# Altium schematic symbol library LATTICEPLDS_Library.SchLib: 291 symbols (part 1 of 32) (continued)
## iCE40HX1K-TQ144
designator U?
SPLIT_INST: TRUE; SWAP_INFO: (S1+S2+S3+S4+S5+S6)
part A pins: 112 IOT_73 (io), 113 IOT_74 (io), 114 IOT_75 (io), 115 IOT_76 (io), 116 IOT_77 (io), 117 IOT_78 (io), 118 IOT_79 (io), 119 IOT_80 (io), 120 IOT_81 (io), 121 IOT_82 (io), 122 IOT_83 (io), 123 VCCIO_0 (power), 128 IOT_84_GBIN1 (io), 129 IOT_85_GBIN0 (io), 133 VCCIO_0 (power), 134 IOT_87 (io), 135 IOT_88 (io), 136 IOT_89 (io), 137 IOT_90 (io), 138 IOT_91 (io), 139 IOT_92 (io), 141 IOT_93 (io), 142 IOT_94 (io), 143 IOT_95 (io), 144 IOT_96 (io)
part B pins: 73 IOR_48 (io), 74 IOR_49 (io), 75 IOR_50 (io), 76 IOR_51 (io), 78 IOR_52 (io), 79 IOR_53 (io), 80 IOR_54 (io), 81 IOR_55 (io), 87 IOR_56 (io), 88 IOR_57 (io), 89 VCCIO_1 (power), 90 IOR_58 (io), 91 IOR_59 (io), 93 IOR_60_GBIN3 (io), 94 IOR_61_GBIN2 (io), 95 IOR_62 (io), 96 IOR_63 (io), 97 IOR_64 (io), 98 IOR_65 (io), 99 IOR_66 (io), 100 VCCIO_1 (power), 101 IOR_67 (io), 102 IOR_68 (io), 104 IOR_69 (io), 105 IOR_70 (io), 106 IOR_71 (io), 107 IOR_72 (io)
part C pins: 37 IOB_24 (io), 38 IOB_25 (io), 39 IOB_26 (io), 41 IOB_27 (io), 42 IOB_28 (io), 43 IOB_29 (io), 44 IOB_30 (io), 45 IOB_31 (io), 46 VCCIO_2 (power), 47 IOB_32 (io), 48 IOB_33 (io), 49 IOB_35_GBIN5 (io), 50 IOB_36_GBIN4 (io), 52 IOB_34 (io), 56 IOB_37 (io), 57 VCCIO_2 (power), 58 IOB_38 (io), 60 IOB_39 (io), 61 IOB_40 (io), 62 IOB_41 (io), 63 IOB_42_CBSEL0 (io), 64 IOB_43_CBSEL1 (io), 65 CDONE (io), 66 CRESET_B (io)
part D pins: 1 IOL_1A (io), 2 IOL_1B (io), 3 IOL_2A (io), 4 IOL_2B (io), 6 VCCIO_3 (power), 7 IOL_3A (io), 8 IOL_3B (io), 9 IOL_4A (io), 10 IOL_4B (io), 11 IOL_5A (io), 12 IOL_5B (io), 19 IOL_6A (io), 20 IOL_6B_GBIN7 (io), 21 IOL_7A_GBIN6 (io), 22 IOL_7B (io), 23 IOL_8A (io), 24 IOL_8B (io), 25 IOL_9A (io), 26 IOL_9B (io), 28 IOL_10A (io), 29 IOL_10B (io), 30 VCCIO_3 (power), 31 IOL_11A (io), 32 IOL_11B (io), 33 IOL_12A (io), 34 IOL_12B (io)
part E pins: 67 IOB_44_SDO (io), 68 IOB_45_SDI (io), 70 IOB_46_SCK (io), 71 IOB_47_SS (io), 72 VCC_SPI (power)
part F pins: 5 GND (power), 13 GND (power), 14 GND (power), 15 NC (power), 16 NC (power), 17 NC (power), 18 NC (power), 27 VCC (power), 35 GNDPLL (power), 36 VCCPLL (power), 40 NC (power), 51 VCC (power), 53 NC (power), 54 NC (power), 55 NC (power), 59 GND (power), 69 GND (power), 77 NC (power), 82 NC (power), 83 NC (power), 84 NC (power), 85 NC (power), 86 GND (power), 92 VCC (power), 103 GND (power), 108 VPP_2V5 (power), 109 VPP_FAST (power), 110 NC (power), 111 VCC (power), 124 NC (power), 125 NC (power), 126 NC (power), 127 NC (power), 130 NC (power), 131 NC (power), 132 GND (power), 140 GND (power)
part A text: BANK0
part B text: BANK1
part C text: BANK2
part D text: BANK3
part E text: SPI
part F text: POWER

## iCE40HX1K-VQ100
designator U?
SPLIT_INST: TRUE; SWAP_INFO: (S1+S2+S3+S4+S5+S6)
part A pins: 78 IOT_73 (io), 79 IOT_74 (io), 80 IOT_75 (io), 81 IOT_77 (io), 82 IOT_78 (io), 83 IOT_79 (io), 85 IOT_80 (io), 86 IOT_81 (io), 87 IOT_82 (io), 88 VCCIO_0 (power), 89 IOT_84_GBIN1 (io), 90 IOT_85_GBIN0 (io), 91 IOT_86 (io), 92 VCCIO_0 (power), 93 IOT_87 (io), 94 IOT_88 (io), 95 IOT_89 (io), 96 IOT_90 (io), 97 IOT_91 (io), 99 IOT_93 (io), 100 IOT_95 (io)
part B pins: 51 IOR_52 (io), 52 IOR_53 (io), 53 IOR_54 (io), 54 IOR_55 (io), 56 IOR_56 (io), 57 IOR_57 (io), 58 VCCIO_1 (power), 59 IOR_58 (io), 60 IOR_59 (io), 62 IOR_60_GBIN3 (io), 63 IOR_61_GBIN2 (io), 64 IOR_63 (io), 65 IOR_64 (io), 66 IOR_65 (io), 67 VCCIO_1 (power), 68 IOR_67 (io), 69 IOR_68 (io), 71 IOR_69 (io), 72 IOR_70 (io), 73 IOR_71 (io), 74 IOR_72 (io)
part C pins: 26 IOB_26 (io), 27 IOB_27 (io), 28 IOB_28 (io), 29 IOB_29 (io), 30 IOB_30 (io), 31 VCCIO_2 (power), 33 IOB_35_GBIN5 (io), 34 IOB_36_GBIN4 (io), 36 IOB_34 (io), 37 IOB_37 (io), 38 VCCIO_2 (power), 40 IOB_41 (io), 41 IOB_42_CBSEL0 (io), 42 IOB_43_CBSEL1 (io), 43 CDONE (io), 44 CRESET_B (io)
part D pins: 1 IOL_1A (io), 2 IOL_1B (io), 3 IOL_2A (io), 4 IOL_2B (io), 6 VCCIO_3 (power), 7 IOL_3A (io), 8 IOL_3B (io), 9 IOL_5A (io), 10 IOL_5B (io), 12 IOL_6A (io), 13 IOL_6B_GBIN7 (io), 14 VCCIO_3 (power), 15 IOL_7A_GBIN6 (io), 16 IOL_7B (io), 18 IOL_8A (io), 19 IOL_8B (io), 20 IOL_10A (io), 21 IOL_10B (io), 22 VCCIO_3 (power), 24 IOL_12A (io), 25 IOL_12B (io)
part E pins: 45 IOB_44_SDO (io), 46 IOB_45_SDI (io), 48 IOB_46_SCK (io), 49 IOB_47_SS (io), 50 VCC_SPI (power)
part F pins: 5 GND (power), 11 VCC (power), 17 GND (power), 23 GND (power), 32 GND (power), 35 VCC (power), 39 GND (power), 47 GND (power), 55 GND (power), 61 VCC (power), 70 GND (power), 75 VPP_2V5 (power), 76 VPP_FAST (power), 77 VCC (power), 84 GND (power), 98 GND (power)
part A text: BANK0
part B text: BANK1
part C text: BANK2
part D text: BANK3
part E text: SPI
part F text: POWER

## iCE40HX4K-CB132
designator U?
SPLIT_INST: TRUE; SWAP_INFO: (S1+S2+S3+S4+S5+S6)
part A pins: A1 IOT_225 (io), A2 IOT_223 (io), A3 IOT_222 (io), A4 IOT_219 (io), A5 IOT_208 (io), A6 IOT_198_GBIN0 (io), A7 IOT_197_GBIN1 (io), A8 VCCIO_0 (power), A10 IOT_181 (io), A11 IOT_179 (io), A12 IOT_170 (io), C4 IOT_221 (io), C5 IOT_212 (io), C6 IOT_206 (io), C7 IOT_200 (io), C9 IOT_190 (io), C10 IOT_186 (io), C11 IOT_174 (io), C12 IOT_172 (io), D5 IOT_211 (io), D6 IOT_207 (io), D7 IOT_202 (io), D9 IOT_188 (io), D10 IOT_177 (io), D11 IOT_178 (io), F6 VCCIO_0 (power)
part B pins: B14 IOR_161 (io), C14 IOR_154 (io), D12 IOR_160 (io), D14 IOR_152 (io), E11 IOR_146 (io), E12 IOR_147 (io), E14 IOR_148 (io), F9 VCCIO_1 (power), F11 IOR_144 (io), F12 IOR_137 (io), F14 IOR_140_GBIN3 (io), G11 IOR_136 (io), G12 IOR_129 (io), G14 IOR_141_GBIN2 (io), H11 IOR_128 (io), H12 IOR_120 (io), H14 VCCIO_1 (power), J11 IOR_119 (io), J12 IOR_118 (io), K11 IOR_116 (io), K12 IOR_115 (io), K14 IOR_117 (io), L12 IOR_111 (io), L14 IOR_114 (io), M12 IOR_109 (io), N14 IOR_112 (io), P14 IOR_110 (io)
part C pins: J9 VCCIO_2 (power), L4 IOB_72 (io), L5 IOB_71 (io), L6 IOB_78 (io), L8 IOB_87 (io), L9 IOB_103_CBSEL0 (io), L10 CRESET_B (io), M3 IOB_64 (io), M4 IOB_63 (io), M5 VCCIO_2 (power), M6 IOB_77 (io), M7 IOB_79 (io), M9 IOB_91 (io), M10 CDONE (io), P2 IOB_56 (io), P3 IOB_59 (io), P4 IOB_73 (io), P5 IOB_74 (io), P7 IOB_81_GBIN5 (io), P8 IOB_82_GBIN4 (io), P9 IOB_89 (io), P10 IOB_104_CBSEL1 (io)
part D pins: B1 IOL_2A (io), C1 IOL_2B (io), C3 IOL_4A (io), D1 IOL_5A (io), D3 IOL_4B (io), D4 IOL_8A (io), E1 IOL_5B (io), E3 VCCIO_3 (power), E4 IOL_8B (io), F3 IOL_9B (io), F4 IOL_9A (io), G1 IOL_13B_GBIN7 (io), G3 IOL_13A (io), G4 IOL_10B (io), H1 IOL_14A_GBIN6 (io), H3 IOL_14B (io), H4 IOL_10A (io), J1 IOL_12B (io), J3 IOL_12A (io), J6 VCCIO_3 (power), K1 VCCIO_3 (power), K3 IOL_18A (io), K4 IOL_18B (io), L1 IOL_23A (io), M1 IOL_23B (io), N1 IOL_25A (io), P1 IOL_25B (io)
part E pins: L11 VCC_SPI (power), M11 IOB_105_SDO (io), P11 IOB_106_SDI (io), P12 IOB_107_SCK (io), P13 IOB_108_SS (io)
part F pins: A9 GND (power), A13 VPP_FAST (power), A14 VPP_2V5 (power), C8 VCCPLL1 (power), D8 GNDPLL1 (power), F1 GND (power), F7 GND (power), F8 VCC (power), G6 VCC (power), G7 GND (power), G8 GND (power), G9 GND (power), H6 GND (power), H7 GND (power), H8 GND (power), H9 VCC (power), J4 VCC (power), J7 VCC (power), J8 GND (power), J14 GND (power), L3 GND (power), L7 GNDPLL0 (power), M8 VCCPLL0 (power), M14 NC (power), P6 GND (power)
part A text: BANK0
part B text: BANK1
part C text: BANK2
part D text: BANK3
part E text: SPI
part F text: POWER

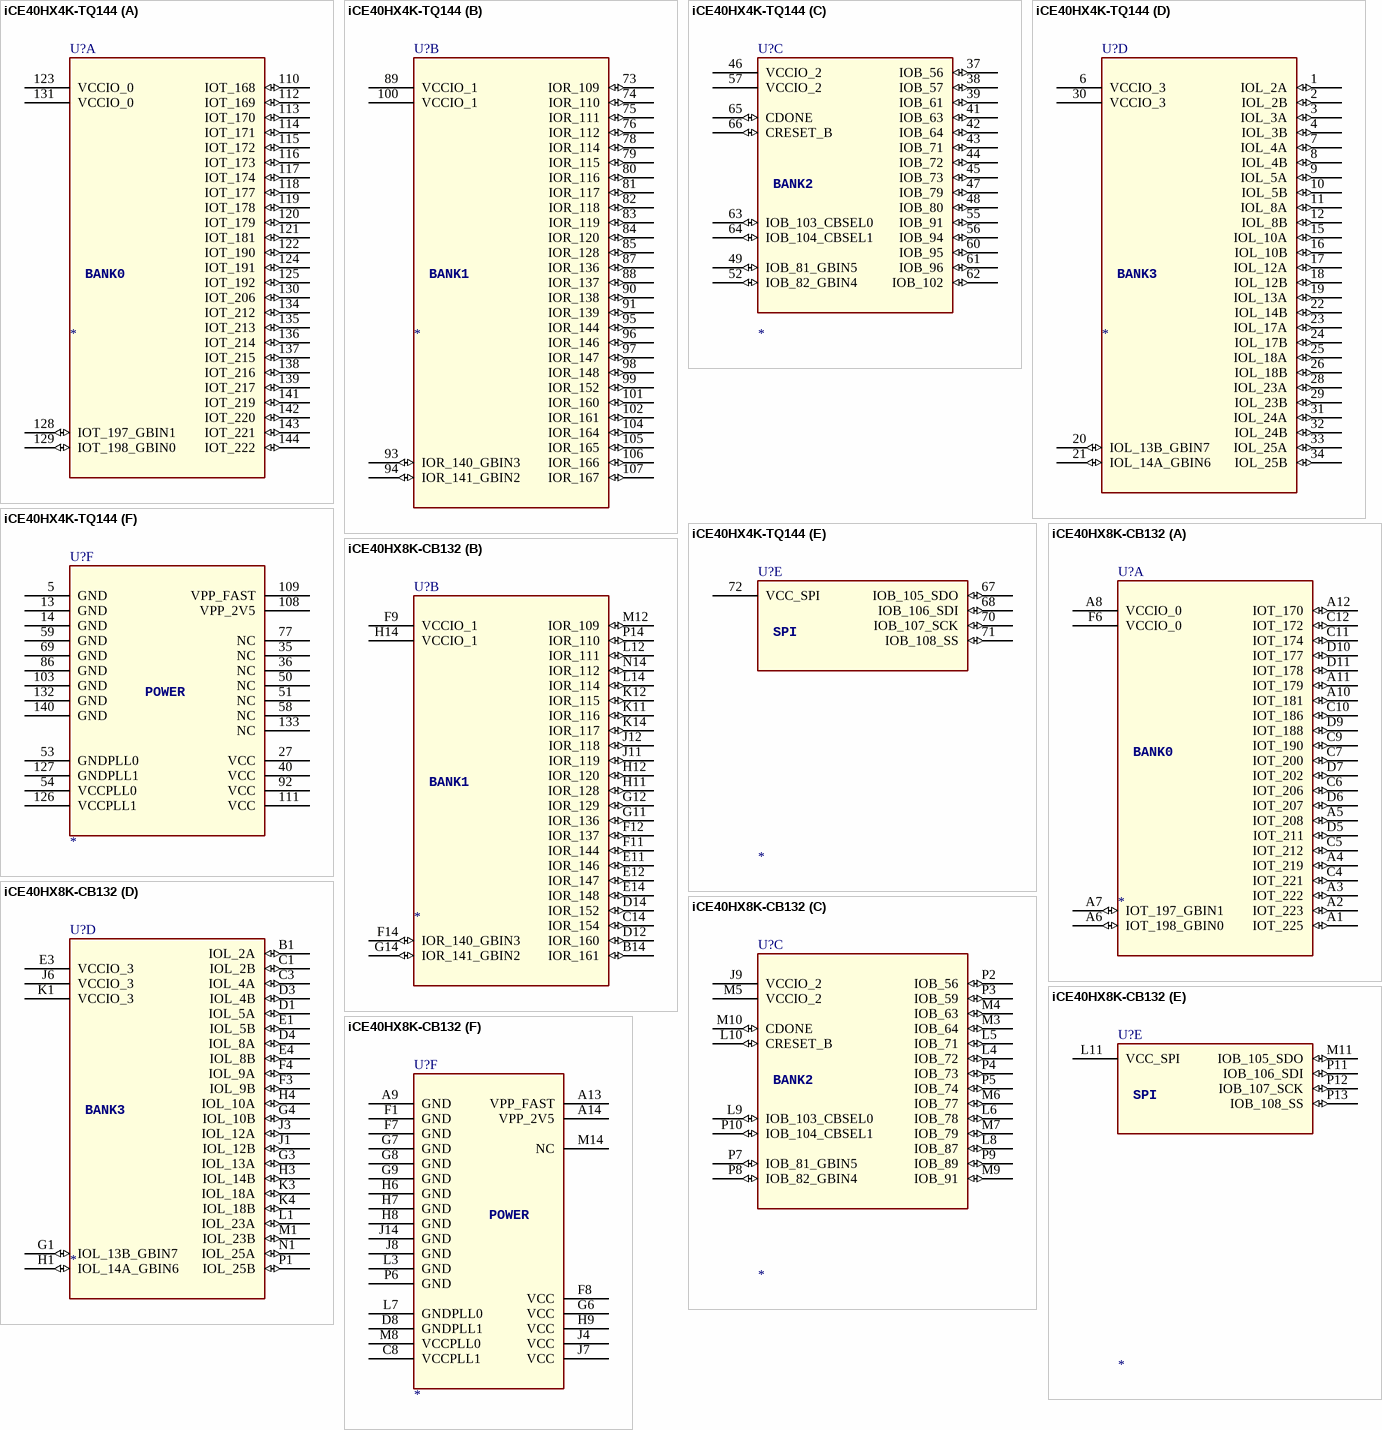
[diagram p4: symbols iCE40HX4K-TQ144 to iCE40HX8K-CB132]

## iCE40HX4K-TQ144
designator U?
SPLIT_INST: TRUE; SWAP_INFO: (S1+S2+S3+S4+S5+S6)
part A pins: 110 IOT_168 (io), 112 IOT_169 (io), 113 IOT_170 (io), 114 IOT_171 (io), 115 IOT_172 (io), 116 IOT_173 (io), 117 IOT_174 (io), 118 IOT_177 (io), 119 IOT_178 (io), 120 IOT_179 (io), 121 IOT_181 (io), 122 IOT_190 (io), 123 VCCIO_0 (power), 124 IOT_191 (io), 125 IOT_192 (io), 128 IOT_197_GBIN1 (io), 129 IOT_198_GBIN0 (io), 130 IOT_206 (io), 131 VCCIO_0 (power), 134 IOT_212 (io), 135 IOT_213 (io), 136 IOT_214 (io), 137 IOT_215 (io), 138 IOT_216 (io), 139 IOT_217 (io), 141 IOT_219 (io), 142 IOT_220 (io), 143 IOT_221 (io), 144 IOT_222 (io)
part B pins: 73 IOR_109 (io), 74 IOR_110 (io), 75 IOR_111 (io), 76 IOR_112 (io), 78 IOR_114 (io), 79 IOR_115 (io), 80 IOR_116 (io), 81 IOR_117 (io), 82 IOR_118 (io), 83 IOR_119 (io), 84 IOR_120 (io), 85 IOR_128 (io), 87 IOR_136 (io), 88 IOR_137 (io), 89 VCCIO_1 (power), 90 IOR_138 (io), 91 IOR_139 (io), 93 IOR_140_GBIN3 (io), 94 IOR_141_GBIN2 (io), 95 IOR_144 (io), 96 IOR_146 (io), 97 IOR_147 (io), 98 IOR_148 (io), 99 IOR_152 (io), 100 VCCIO_1 (power), 101 IOR_160 (io), 102 IOR_161 (io), 104 IOR_164 (io), 105 IOR_165 (io), 106 IOR_166 (io), 107 IOR_167 (io)
part C pins: 37 IOB_56 (io), 38 IOB_57 (io), 39 IOB_61 (io), 41 IOB_63 (io), 42 IOB_64 (io), 43 IOB_71 (io), 44 IOB_72 (io), 45 IOB_73 (io), 46 VCCIO_2 (power), 47 IOB_79 (io), 48 IOB_80 (io), 49 IOB_81_GBIN5 (io), 52 IOB_82_GBIN4 (io), 55 IOB_91 (io), 56 IOB_94 (io), 57 VCCIO_2 (power), 60 IOB_95 (io), 61 IOB_96 (io), 62 IOB_102 (io), 63 IOB_103_CBSEL0 (io), 64 IOB_104_CBSEL1 (io), 65 CDONE (io), 66 CRESET_B (io)
part D pins: 1 IOL_2A (io), 2 IOL_2B (io), 3 IOL_3A (io), 4 IOL_3B (io), 6 VCCIO_3 (power), 7 IOL_4A (io), 8 IOL_4B (io), 9 IOL_5A (io), 10 IOL_5B (io), 11 IOL_8A (io), 12 IOL_8B (io), 15 IOL_10A (io), 16 IOL_10B (io), 17 IOL_12A (io), 18 IOL_12B (io), 19 IOL_13A (io), 20 IOL_13B_GBIN7 (io), 21 IOL_14A_GBIN6 (io), 22 IOL_14B (io), 23 IOL_17A (io), 24 IOL_17B (io), 25 IOL_18A (io), 26 IOL_18B (io), 28 IOL_23A (io), 29 IOL_23B (io), 30 VCCIO_3 (power), 31 IOL_24A (io), 32 IOL_24B (io), 33 IOL_25A (io), 34 IOL_25B (io)
part E pins: 67 IOB_105_SDO (io), 68 IOB_106_SDI (io), 70 IOB_107_SCK (io), 71 IOB_108_SS (io), 72 VCC_SPI (power)
part F pins: 5 GND (power), 13 GND (power), 14 GND (power), 27 VCC (power), 35 NC (power), 36 NC (power), 40 VCC (power), 50 NC (power), 51 NC (power), 53 GNDPLL0 (power), 54 VCCPLL0 (power), 58 NC (power), 59 GND (power), 69 GND (power), 77 NC (power), 86 GND (power), 92 VCC (power), 103 GND (power), 108 VPP_2V5 (power), 109 VPP_FAST (power), 111 VCC (power), 126 VCCPLL1 (power), 127 GNDPLL1 (power), 132 GND (power), 133 NC (power), 140 GND (power)
part A text: BANK0
part B text: BANK1
part C text: BANK2
part D text: BANK3
part E text: SPI
part F text: POWER

## iCE40HX8K-CB132
designator U?
SPLIT_INST: TRUE; SWAP_INFO: (S1+S2+S3+S4+S5+S6)
part A pins: A1 IOT_225 (io), A2 IOT_223 (io), A3 IOT_222 (io), A4 IOT_219 (io), A5 IOT_208 (io), A6 IOT_198_GBIN0 (io), A7 IOT_197_GBIN1 (io), A8 VCCIO_0 (power), A10 IOT_181 (io), A11 IOT_179 (io), A12 IOT_170 (io), C4 IOT_221 (io), C5 IOT_212 (io), C6 IOT_206 (io), C7 IOT_200 (io), C9 IOT_190 (io), C10 IOT_186 (io), C11 IOT_174 (io), C12 IOT_172 (io), D5 IOT_211 (io), D6 IOT_207 (io), D7 IOT_202 (io), D9 IOT_188 (io), D10 IOT_177 (io), D11 IOT_178 (io), F6 VCCIO_0 (power)
part B pins: B14 IOR_161 (io), C14 IOR_154 (io), D12 IOR_160 (io), D14 IOR_152 (io), E11 IOR_146 (io), E12 IOR_147 (io), E14 IOR_148 (io), F9 VCCIO_1 (power), F11 IOR_144 (io), F12 IOR_137 (io), F14 IOR_140_GBIN3 (io), G11 IOR_136 (io), G12 IOR_129 (io), G14 IOR_141_GBIN2 (io), H11 IOR_128 (io), H12 IOR_120 (io), H14 VCCIO_1 (power), J11 IOR_119 (io), J12 IOR_118 (io), K11 IOR_116 (io), K12 IOR_115 (io), K14 IOR_117 (io), L12 IOR_111 (io), L14 IOR_114 (io), M12 IOR_109 (io), N14 IOR_112 (io), P14 IOR_110 (io)
part C pins: J9 VCCIO_2 (power), L4 IOB_72 (io), L5 IOB_71 (io), L6 IOB_78 (io), L8 IOB_87 (io), L9 IOB_103_CBSEL0 (io), L10 CRESET_B (io), M3 IOB_64 (io), M4 IOB_63 (io), M5 VCCIO_2 (power), M6 IOB_77 (io), M7 IOB_79 (io), M9 IOB_91 (io), M10 CDONE (io), P2 IOB_56 (io), P3 IOB_59 (io), P4 IOB_73 (io), P5 IOB_74 (io), P7 IOB_81_GBIN5 (io), P8 IOB_82_GBIN4 (io), P9 IOB_89 (io), P10 IOB_104_CBSEL1 (io)
part D pins: B1 IOL_2A (io), C1 IOL_2B (io), C3 IOL_4A (io), D1 IOL_5A (io), D3 IOL_4B (io), D4 IOL_8A (io), E1 IOL_5B (io), E3 VCCIO_3 (power), E4 IOL_8B (io), F3 IOL_9B (io), F4 IOL_9A (io), G1 IOL_13B_GBIN7 (io), G3 IOL_13A (io), G4 IOL_10B (io), H1 IOL_14A_GBIN6 (io), H3 IOL_14B (io), H4 IOL_10A (io), J1 IOL_12B (io), J3 IOL_12A (io), J6 VCCIO_3 (power), K1 VCCIO_3 (power), K3 IOL_18A (io), K4 IOL_18B (io), L1 IOL_23A (io), M1 IOL_23B (io), N1 IOL_25A (io), P1 IOL_25B (io)
part E pins: L11 VCC_SPI (power), M11 IOB_105_SDO (io), P11 IOB_106_SDI (io), P12 IOB_107_SCK (io), P13 IOB_108_SS (io)
part F pins: A9 GND (power), A13 VPP_FAST (power), A14 VPP_2V5 (power), C8 VCCPLL1 (power), D8 GNDPLL1 (power), F1 GND (power), F7 GND (power), F8 VCC (power), G6 VCC (power), G7 GND (power), G8 GND (power), G9 GND (power), H6 GND (power), H7 GND (power), H8 GND (power), H9 VCC (power), J4 VCC (power), J7 VCC (power), J8 GND (power), J14 GND (power), L3 GND (power), L7 GNDPLL0 (power), M8 VCCPLL0 (power), M14 NC (power), P6 GND (power)
part A text: BANK0
part B text: BANK1
part C text: BANK2
part D text: BANK3
part E text: SPI
part F text: POWER

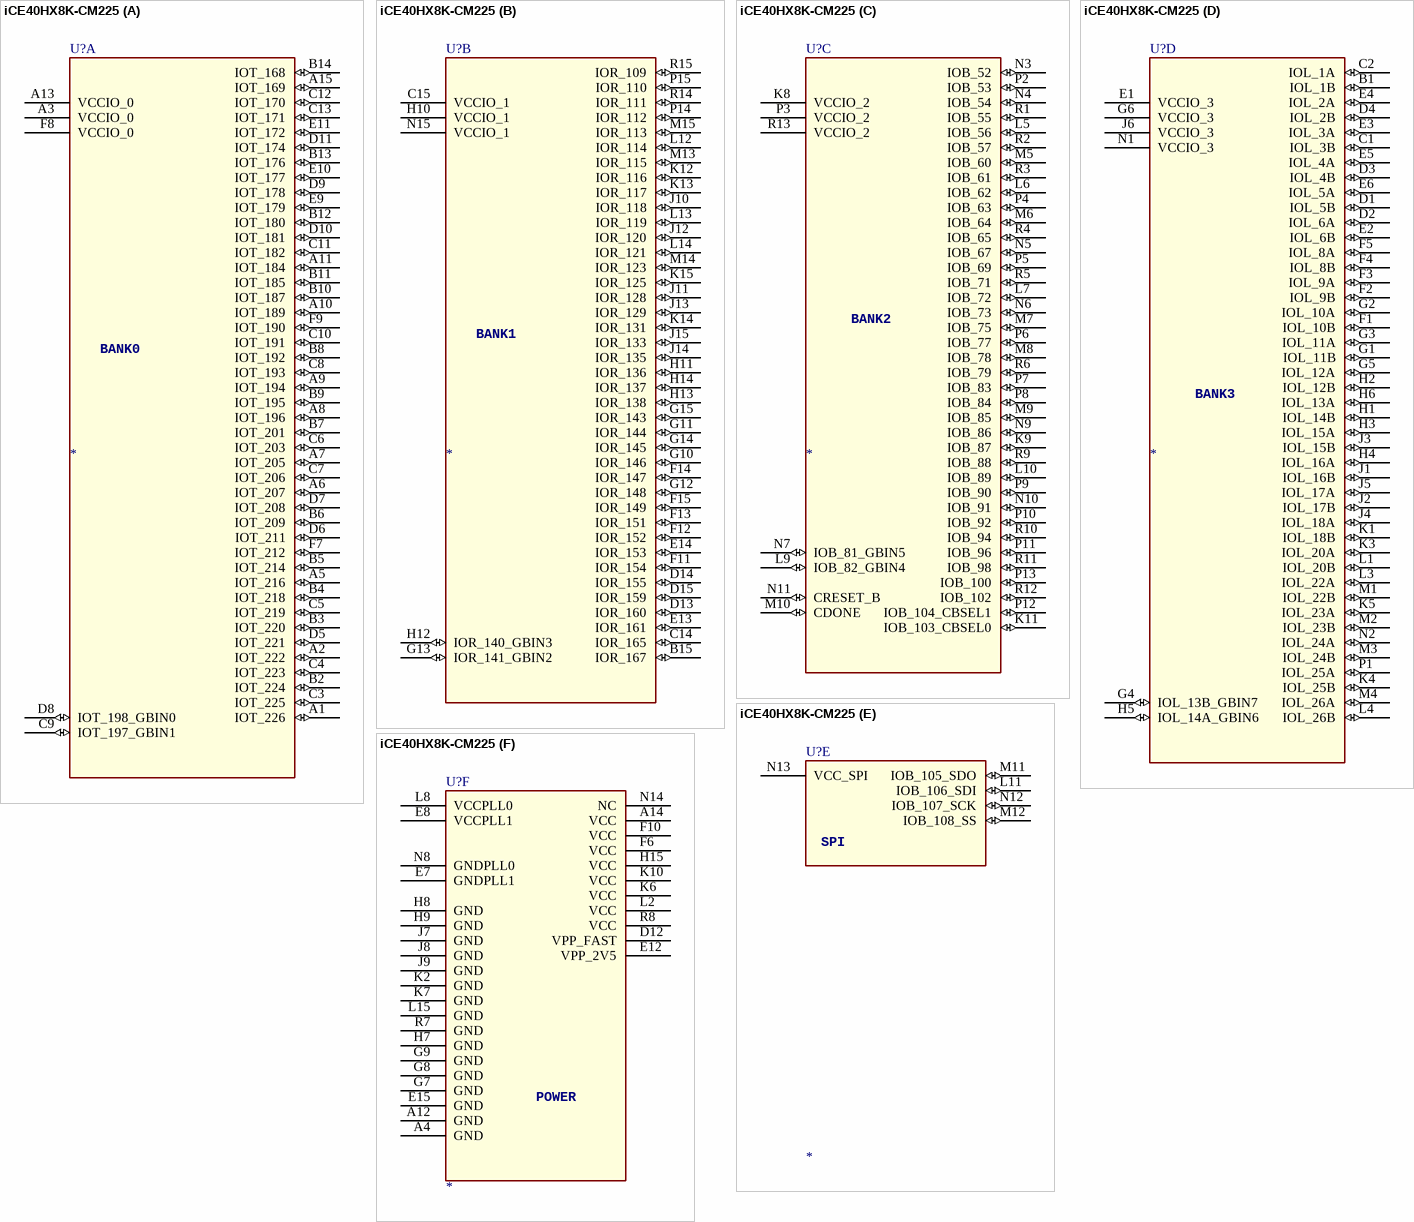
[diagram p5: symbol iCE40HX8K-CM225]

## iCE40HX8K-CM225
designator U?
SWAP_INFO: (S1+S2+S3+S4+S5+S6); SPLIT_INST: TRUE
part A pins: A1 IOT_226 (io), A2 IOT_222 (io), A3 VCCIO_0 (power), A5 IOT_216 (io), A6 IOT_207 (io), A7 IOT_205 (io), A8 IOT_196 (io), A9 IOT_194 (io), A10 IOT_189 (io), A11 IOT_184 (io), A13 VCCIO_0 (power), A15 IOT_169 (io), B2 IOT_224 (io), B3 IOT_220 (io), B4 IOT_218 (io), B5 IOT_214 (io), B6 IOT_209 (io), B7 IOT_201 (io), B8 IOT_192 (io), B9 IOT_195 (io), B10 IOT_187 (io), B11 IOT_185 (io), B12 IOT_180 (io), B13 IOT_176 (io), B14 IOT_168 (io), C3 IOT_225 (io), C4 IOT_223 (io), C5 IOT_219 (io), C6 IOT_203 (io), C7 IOT_206 (io), C8 IOT_193 (io), C9 IOT_197_GBIN1 (io), C10 IOT_191 (io), C11 IOT_182 (io), C12 IOT_170 (io), C13 IOT_171 (io), D5 IOT_221 (io), D6 IOT_211 (io), D7 IOT_208 (io), D8 IOT_198_GBIN0 (io), D9 IOT_178 (io), D10 IOT_181 (io), D11 IOT_174 (io), E9 IOT_179 (io), E10 IOT_177 (io), E11 IOT_172 (io), F7 IOT_212 (io), F8 VCCIO_0 (power), F9 IOT_190 (io)
part B pins: B15 IOR_167 (io), C14 IOR_165 (io), C15 VCCIO_1 (power), D13 IOR_160 (io), D14 IOR_155 (io), D15 IOR_159 (io), E13 IOR_161 (io), E14 IOR_153 (io), F11 IOR_154 (io), F12 IOR_152 (io), F13 IOR_151 (io), F14 IOR_147 (io), F15 IOR_149 (io), G10 IOR_146 (io), G11 IOR_144 (io), G12 IOR_148 (io), G13 IOR_141_GBIN2 (io), G14 IOR_145 (io), G15 IOR_143 (io), H10 VCCIO_1 (power), H11 IOR_136 (io), H12 IOR_140_GBIN3 (io), H13 IOR_138 (io), H14 IOR_137 (io), J10 IOR_118 (io), J11 IOR_128 (io), J12 IOR_120 (io), J13 IOR_129 (io), J14 IOR_135 (io), J15 IOR_133 (io), K12 IOR_116 (io), K13 IOR_117 (io), K14 IOR_131 (io), K15 IOR_125 (io), L12 IOR_114 (io), L13 IOR_119 (io), L14 IOR_121 (io), M13 IOR_115 (io), M14 IOR_123 (io), M15 IOR_113 (io), N15 VCCIO_1 (power), P14 IOR_112 (io), P15 IOR_110 (io), R14 IOR_111 (io), R15 IOR_109 (io)
part C pins: K8 VCCIO_2 (power), K9 IOB_87 (io), K11 IOB_103_CBSEL0 (io), L5 IOB_56 (io), L6 IOB_62 (io), L7 IOB_72 (io), L9 IOB_82_GBIN4 (io), L10 IOB_89 (io), M5 IOB_60 (io), M6 IOB_64 (io), M7 IOB_75 (io), M8 IOB_78 (io), M9 IOB_85 (io), M10 CDONE (io), N3 IOB_52 (io), N4 IOB_54 (io), N5 IOB_67 (io), N6 IOB_73 (io), N7 IOB_81_GBIN5 (io), N9 IOB_86 (io), N10 IOB_91 (io), N11 CRESET_B (io), P2 IOB_53 (io), P3 VCCIO_2 (power), P4 IOB_63 (io), P5 IOB_69 (io), P6 IOB_77 (io), P7 IOB_83 (io), P8 IOB_84 (io), P9 IOB_90 (io), P10 IOB_92 (io), P11 IOB_96 (io), P12 IOB_104_CBSEL1 (io), P13 IOB_100 (io), R1 IOB_55 (io), R2 IOB_57 (io), R3 IOB_61 (io), R4 IOB_65 (io), R5 IOB_71 (io), R6 IOB_79 (io), R9 IOB_88 (io), R10 IOB_94 (io), R11 IOB_98 (io), R12 IOB_102 (io), R13 VCCIO_2 (power)
part D pins: B1 IOL_1B (io), C1 IOL_3B (io), C2 IOL_1A (io), D1 IOL_5B (io), D2 IOL_6A (io), D3 IOL_4B (io), D4 IOL_2B (io), E1 VCCIO_3 (power), E2 IOL_6B (io), E3 IOL_3A (io), E4 IOL_2A (io), E5 IOL_4A (io), E6 IOL_5A (io), F1 IOL_10B (io), F2 IOL_9B (io), F3 IOL_9A (io), F4 IOL_8B (io), F5 IOL_8A (io), G1 IOL_11B (io), G2 IOL_10A (io), G3 IOL_11A (io), G4 IOL_13B_GBIN7 (io), G5 IOL_12A (io), G6 VCCIO_3 (power), H1 IOL_14B (io), H2 IOL_12B (io), H3 IOL_15A (io), H4 IOL_16A (io), H5 IOL_14A_GBIN6 (io), H6 IOL_13A (io), J1 IOL_16B (io), J2 IOL_17B (io), J3 IOL_15B (io), J4 IOL_18A (io), J5 IOL_17A (io), J6 VCCIO_3 (power), K1 IOL_18B (io), K3 IOL_20A (io), K4 IOL_25B (io), K5 IOL_23A (io), L1 IOL_20B (io), L3 IOL_22A (io), L4 IOL_26B (io), M1 IOL_22B (io), M2 IOL_23B (io), M3 IOL_24B (io), M4 IOL_26A (io), N1 VCCIO_3 (power), N2 IOL_24A (io), P1 IOL_25A (io)
part E pins: L11 IOB_106_SDI (io), M11 IOB_105_SDO (io), M12 IOB_108_SS (io), N12 IOB_107_SCK (io), N13 VCC_SPI (power)
part F pins: A4 GND (power), A12 GND (power), A14 VCC (power), D12 VPP_FAST (power), E7 GNDPLL1 (power), E8 VCCPLL1 (power), E12 VPP_2V5 (power), E15 GND (power), F6 VCC (power), F10 VCC (power), G7 GND (power), G8 GND (power), G9 GND (power), H7 GND (power), H8 GND (power), H9 GND (power), H15 VCC (power), J7 GND (power), J8 GND (power), J9 GND (power), K2 GND (power), K6 VCC (power), K7 GND (power), K10 VCC (power), L2 VCC (power), L8 VCCPLL0 (power), L15 GND (power), N8 GNDPLL0 (power), N14 NC (power), R7 GND (power), R8 VCC (power)
part A text: BANK0
part B text: BANK1
part C text: BANK2
part D text: BANK3
part E text: SPI
part F text: POWER

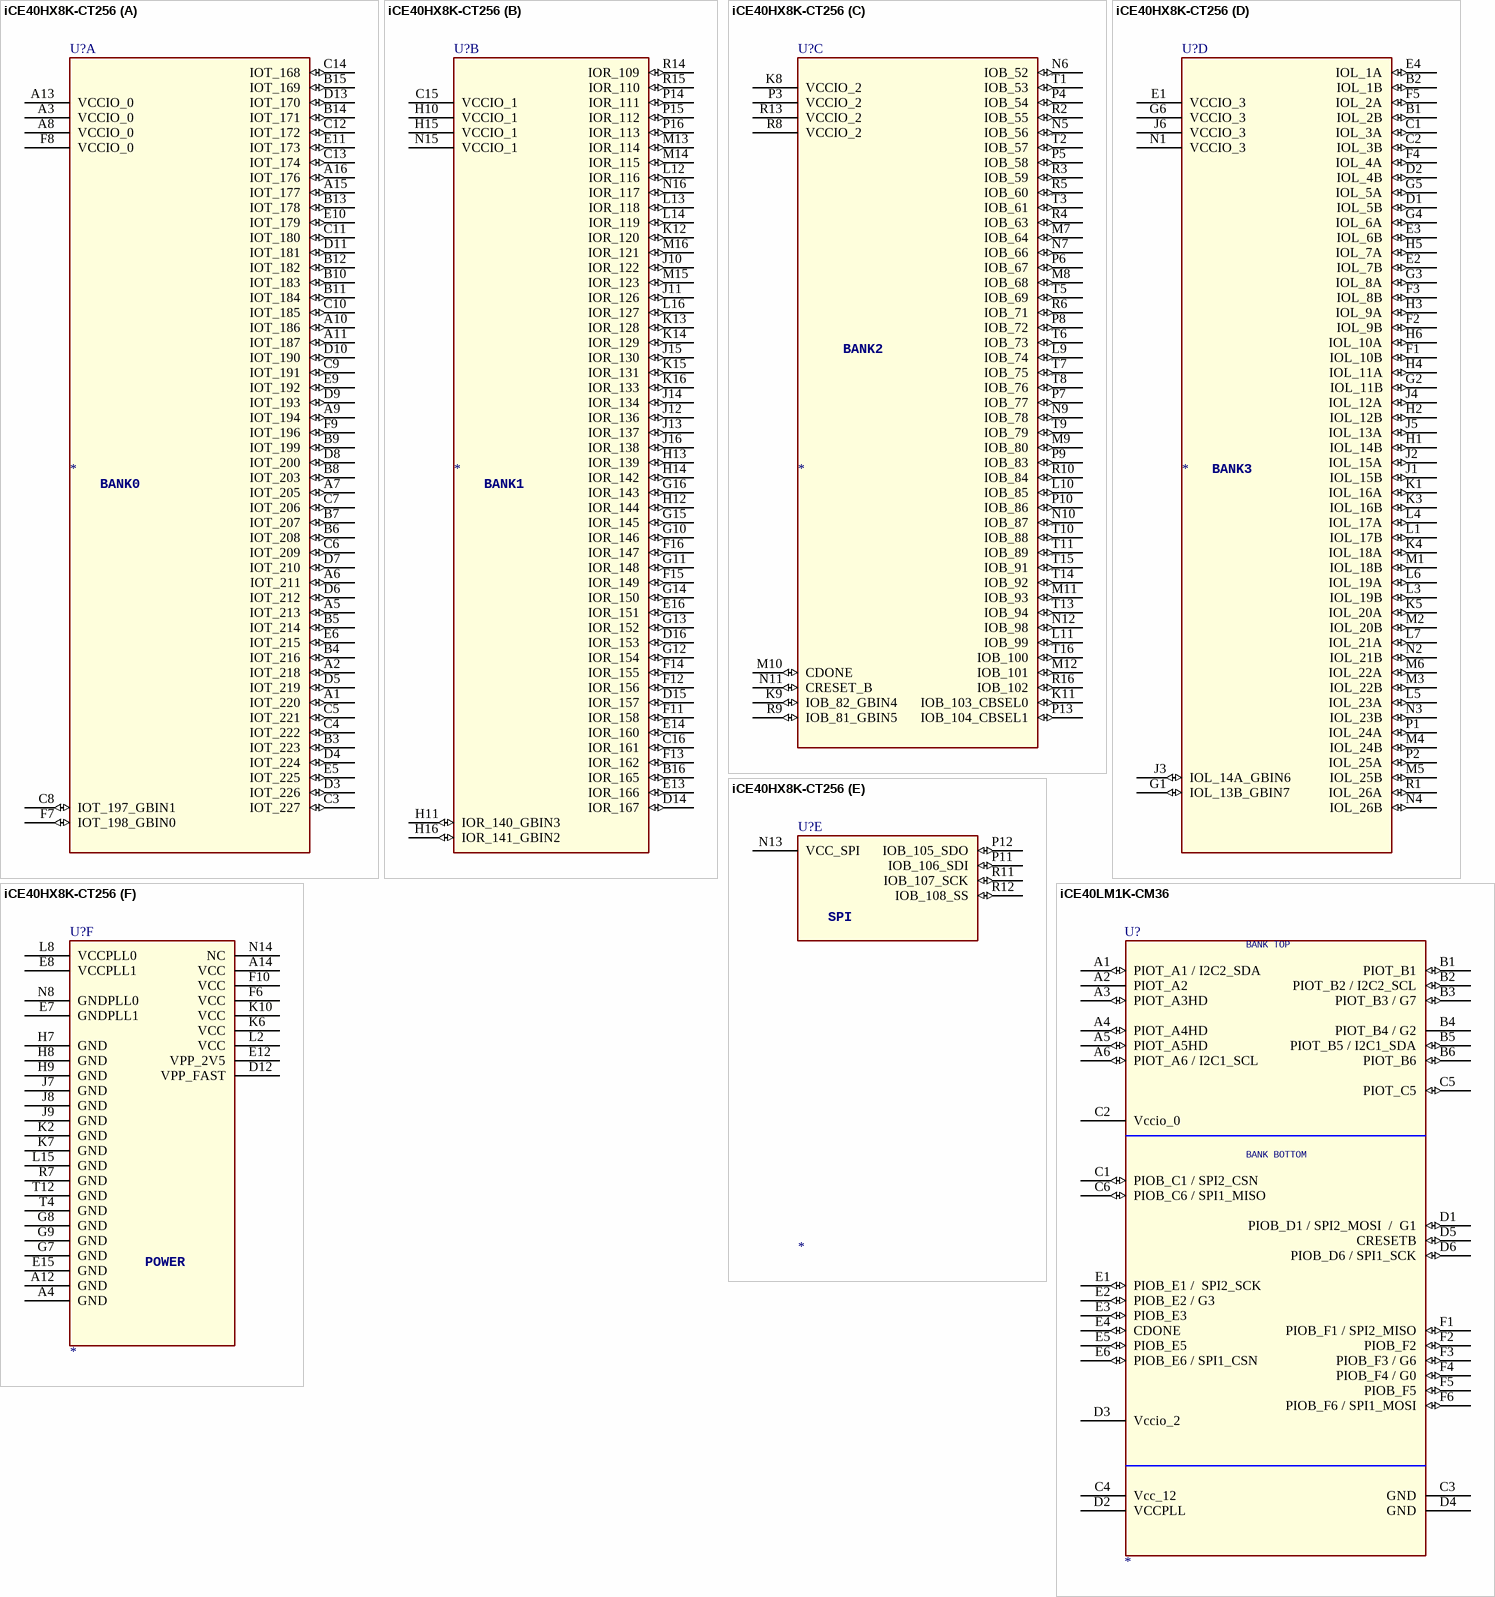
[diagram p6: symbols iCE40HX8K-CT256 to iCE40LM1K-CM36]

## iCE40HX8K-CT256
designator U?
SWAP_INFO: (S1+S2+S3+S4+S5+S6); SPLIT_INST: TRUE
part A pins: A1 IOT_220 (io), A2 IOT_218 (io), A3 VCCIO_0 (power), A5 IOT_213 (io), A6 IOT_211 (io), A7 IOT_205 (io), A8 VCCIO_0 (power), A9 IOT_194 (io), A10 IOT_186 (io), A11 IOT_187 (io), A13 VCCIO_0 (power), A15 IOT_177 (io), A16 IOT_176 (io), B3 IOT_223 (io), B4 IOT_216 (io), B5 IOT_214 (io), B6 IOT_208 (io), B7 IOT_207 (io), B8 IOT_203 (io), B9 IOT_199 (io), B10 IOT_183 (io), B11 IOT_184 (io), B12 IOT_182 (io), B13 IOT_178 (io), B14 IOT_171 (io), B15 IOT_169 (io), C3 IOT_227 (io), C4 IOT_222 (io), C5 IOT_221 (io), C6 IOT_209 (io), C7 IOT_206 (io), C8 IOT_197_GBIN1 (io), C9 IOT_191 (io), C10 IOT_185 (io), C11 IOT_180 (io), C12 IOT_172 (io), C13 IOT_174 (io), C14 IOT_168 (io), D3 IOT_226 (io), D4 IOT_224 (io), D5 IOT_219 (io), D6 IOT_212 (io), D7 IOT_210 (io), D8 IOT_200 (io), D9 IOT_193 (io), D10 IOT_190 (io), D11 IOT_181 (io), D13 IOT_170 (io), E5 IOT_225 (io), E6 IOT_215 (io), E9 IOT_192 (io), E10 IOT_179 (io), E11 IOT_173 (io), F7 IOT_198_GBIN0 (io), F8 VCCIO_0 (power), F9 IOT_196 (io)
part B pins: B16 IOR_165 (io), C15 VCCIO_1 (power), C16 IOR_161 (io), D14 IOR_167 (io), D15 IOR_157 (io), D16 IOR_153 (io), E13 IOR_166 (io), E14 IOR_160 (io), E16 IOR_151 (io), F11 IOR_158 (io), F12 IOR_156 (io), F13 IOR_162 (io), F14 IOR_155 (io), F15 IOR_149 (io), F16 IOR_147 (io), G10 IOR_146 (io), G11 IOR_148 (io), G12 IOR_154 (io), G13 IOR_152 (io), G14 IOR_150 (io), G15 IOR_145 (io), G16 IOR_143 (io), H10 VCCIO_1 (power), H11 IOR_140_GBIN3 (io), H12 IOR_144 (io), H13 IOR_139 (io), H14 IOR_142 (io), H15 VCCIO_1 (power), H16 IOR_141_GBIN2 (io), J10 IOR_122 (io), J11 IOR_126 (io), J12 IOR_136 (io), J13 IOR_137 (io), J14 IOR_134 (io), J15 IOR_130 (io), J16 IOR_138 (io), K12 IOR_120 (io), K13 IOR_128 (io), K14 IOR_129 (io), K15 IOR_131 (io), K16 IOR_133 (io), L12 IOR_116 (io), L13 IOR_118 (io), L14 IOR_119 (io), L16 IOR_127 (io), M13 IOR_114 (io), M14 IOR_115 (io), M15 IOR_123 (io), M16 IOR_121 (io), N15 VCCIO_1 (power), N16 IOR_117 (io), P14 IOR_111 (io), P15 IOR_112 (io), P16 IOR_113 (io), R14 IOR_109 (io), R15 IOR_110 (io)
part C pins: K8 VCCIO_2 (power), K9 IOB_82_GBIN4 (io), K11 IOB_103_CBSEL0 (io), L9 IOB_74 (io), L10 IOB_85 (io), L11 IOB_99 (io), M7 IOB_64 (io), M8 IOB_68 (io), M9 IOB_80 (io), M10 CDONE (io), M11 IOB_93 (io), M12 IOB_101 (io), N5 IOB_56 (io), N6 IOB_52 (io), N7 IOB_66 (io), N9 IOB_78 (io), N10 IOB_87 (io), N11 CRESET_B (io), N12 IOB_98 (io), P3 VCCIO_2 (power), P4 IOB_54 (io), P5 IOB_58 (io), P6 IOB_67 (io), P7 IOB_77 (io), P8 IOB_72 (io), P9 IOB_83 (io), P10 IOB_86 (io), P13 IOB_104_CBSEL1 (io), R2 IOB_55 (io), R3 IOB_59 (io), R4 IOB_63 (io), R5 IOB_60 (io), R6 IOB_71 (io), R8 VCCIO_2 (power), R9 IOB_81_GBIN5 (io), R10 IOB_84 (io), R13 VCCIO_2 (power), R16 IOB_102 (io), T1 IOB_53 (io), T2 IOB_57 (io), T3 IOB_61 (io), T5 IOB_69 (io), T6 IOB_73 (io), T7 IOB_75 (io), T8 IOB_76 (io), T9 IOB_79 (io), T10 IOB_88 (io), T11 IOB_89 (io), T13 IOB_94 (io), T14 IOB_92 (io), T15 IOB_91 (io), T16 IOB_100 (io)
part D pins: B1 IOL_2B (io), B2 IOL_1B (io), C1 IOL_3A (io), C2 IOL_3B (io), D1 IOL_5B (io), D2 IOL_4B (io), E1 VCCIO_3 (power), E2 IOL_7B (io), E3 IOL_6B (io), E4 IOL_1A (io), F1 IOL_10B (io), F2 IOL_9B (io), F3 IOL_8B (io), F4 IOL_4A (io), F5 IOL_2A (io), G1 IOL_13B_GBIN7 (io), G2 IOL_11B (io), G3 IOL_8A (io), G4 IOL_6A (io), G5 IOL_5A (io), G6 VCCIO_3 (power), H1 IOL_14B (io), H2 IOL_12B (io), H3 IOL_9A (io), H4 IOL_11A (io), H5 IOL_7A (io), H6 IOL_10A (io), J1 IOL_15B (io), J2 IOL_15A (io), J3 IOL_14A_GBIN6 (io), J4 IOL_12A (io), J5 IOL_13A (io), J6 VCCIO_3 (power), K1 IOL_16A (io), K3 IOL_16B (io), K4 IOL_18A (io), K5 IOL_20A (io), L1 IOL_17B (io), L3 IOL_19B (io), L4 IOL_17A (io), L5 IOL_23A (io), L6 IOL_19A (io), L7 IOL_21A (io), M1 IOL_18B (io), M2 IOL_20B (io), M3 IOL_22B (io), M4 IOL_24B (io), M5 IOL_25B (io), M6 IOL_22A (io), N1 VCCIO_3 (power), N2 IOL_21B (io), N3 IOL_23B (io), N4 IOL_26B (io), P1 IOL_24A (io), P2 IOL_25A (io), R1 IOL_26A (io)